# Altium footprint library 3.22-杂项.PcbLib: 985 footprints (part 7 of 64)
Each footprint in its own frame and in the unit in brackets; x right, y up, seen from the top. Pads: shape width x height; smd on the part's side, far side on the other; paste and mask are expansions set on the pad; w line width, h text height; cw(c..) or ccw(c..) is an arc to the next point about the centre after c.
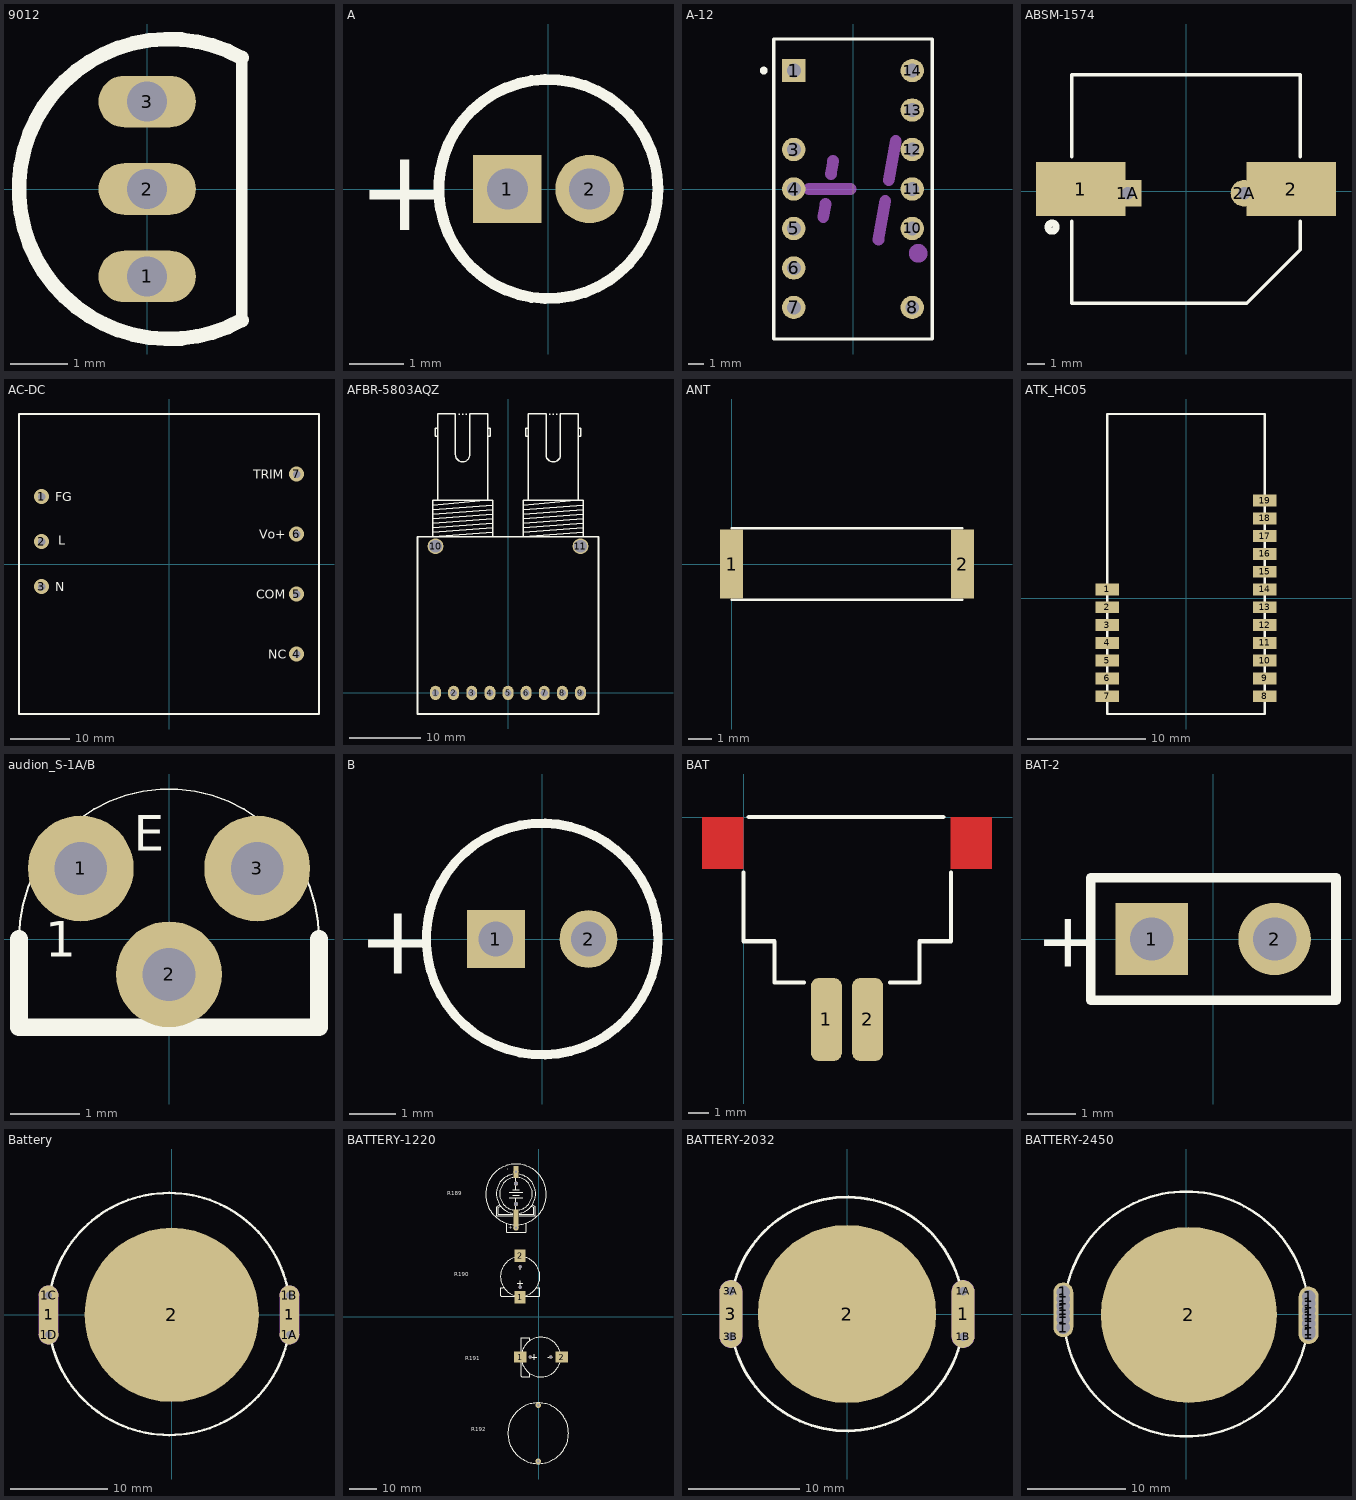
[diagram p6: the footprints below, top view; thin cyan lines are the x and y axes]

## 9012 [mm]
pads (3):
  oval 1.7x0.9 hole 0.7: 1(0,-1.524) 2(0,0) 3(0,1.524)
Top Overlay:
  lines w0.203: 1.651,-2.286 1.651,2.286
  lines w0.254: 1.651,-2.286 cw(c0.381,0) 1.651,2.286

## A [mm] "Capacitor, Electrolytic, Radial; Body 4 x 5 mm (Dia.xH typ); Pin Spacing 1.5 mm (typ)"
pads (2):
  rect 1.25x1.25 hole 0.75: 1(-0.75,0)
  round 1.25 hole 0.75: 2(0.75,0)
Top Overlay:
  circle w0.2: c0,0 r2
  text "+" at -3.475,-0.75 h1.5

## A-12 [mm] "LED, Universal ? Overflow, 7.62 mm, RHD; 14 Leads (2 Absent); Row Space 7.62 mm; Pitch 2.54 mm"
height 6.35
pads (12):
  rect 1.5x1.5 hole 0.9: 1(-3.81,7.62)
  round 1.5 hole 0.9: 3(-3.81,2.54) 4(-3.81,0) 5(-3.81,-2.54) 6(-3.81,-5.08) 7(-3.81,-7.62) 8(3.81,-7.62) 10(3.81,-2.54) 11(3.81,0) 12(3.81,2.54) 13(3.81,5.08) 14(3.81,7.62)
Top Overlay:
  circle w0.25: c-5.75,7.62 r0.125
  lines w0.2: -5.1,-9.65 5.1,-9.65 5.1,9.65 -5.1,9.65 -5.1,-9.65
Mechanical 1:
  circle w0.86: c4.19,-4.139 r0.17
  lines w0.762: -2.83,0 -0.17,0 ; -1.911,-1.799 -1.764,-0.962 ; -1.427,0.961 -1.28,1.8 ; 1.63,-3.262 2.071,-0.764 ; 2.303,0.565 2.747,3.084

## ABSM-1574 [mm] "Magnetic Transducer Buzzer"
pads (4):
  rect 5x3 smd: 1(-5.9,0.12) 2(5.9,0.12)
  rect 1.5x1.5 hole 0.7: 1A(-3.25,-0.12)
  round 1.5 hole 0.7: 2A(3.25,-0.12)
Top Overlay:
  circle w0.4: c-7.5,-2.014 r0.227
  lines w0.2: -6.4,-1.68 -6.4,-6.28 3.4,-6.28 6.4,-3.28 6.4,-1.68 ; -6.4,1.92 -6.4,6.52 6.4,6.52 6.4,1.92

## AC-DC [mil] "电源模块AC/DC，50.8宽，50.8长 陕西雷能电子"
height 500
pads (7):
  round 100 hole 50: 1(-850,450) 2(-850,150) 3(-850,-150) 4(850,-600) 5(850,-200) 6(850,200) 7(850,600)
Top Overlay:
  lines w12: -1000,-1000 1000,-1000 1000,1000 -1000,1000 -1000,-1000
  text "NC" at 660,-630 h60
  text "N" at -760,-180 h60
  text "COM" at 580,-230 h60
  text "TRIM" at 560,570 h60
  text "L" at -740,130 h60
  text "FG" at -760,420 h60
  text "Vo+" at 600,170 h60

## AFBR-5803AQZ [mm] "光以太网"
height 14.8
pads (11):
  oval 1.524x2 hole 1: 1(-10.16,0) 2(-7.62,0) 3(-5.08,0) 4(-2.54,0) 5(0,0) 6(2.54,0) 7(5.08,0) 8(7.62,0) 9(10.16,0)
  round 2.2 hole 1.8: 10(-10.16,20.54) 11(10.16,20.54)
Top Overlay:
  lines w0.2: -10.559,23.15 -2.159,23.785 ; -10.559,23.785 -2.159,24.42 ; -10.559,24.42 -2.159,25.055 ; -10.559,25.055 -2.159,25.69 ; -10.559,25.69 -2.159,26.325 ; -10.559,26.325 -3.184,26.98 ; -10.55,22.515 -2.159,23.15 ; -9.859,35.985 -10.225,35.985 -10.225,37.085 -9.859,37.085 ; -7.359,33.378 ccw(c-6.359,33.378) -5.359,33.385 -5.359,39.08 -2.859,39.08 -2.859,26.98 -9.859,26.98 -9.859,39.08 -7.359,39.08 -7.359,33.378 ; -6.923,39.047 -6.796,39.047 ; -6.415,39.047 -6.288,39.047 ; -5.907,39.047 -5.78,39.047 ; -2.859,35.985 -2.478,35.985 -2.478,37.085 -2.859,37.085 ; -2.168,22.515 -10.559,21.88 ; 2.141,23.15 10.541,23.785 ; 2.141,23.785 10.541,24.42 ; 2.141,24.42 10.541,25.055 ; 2.141,25.055 10.541,25.69 ; 2.141,25.69 10.541,26.325 ; 2.141,26.325 9.516,26.98 ; 2.15,22.515 10.541,23.15 ; 2.841,35.985 2.475,35.985 2.475,37.085 2.841,37.085 ; 5.341,33.378 ccw(c6.341,33.378) 7.341,33.385 7.341,39.08 9.841,39.08 9.841,26.98 2.841,26.98 2.841,39.08 5.341,39.08 5.341,33.378 ; 5.777,39.047 5.904,39.047 ; 6.285,39.047 6.412,39.047 ; 6.793,39.047 6.92,39.047 ; 9.841,35.985 10.222,35.985 10.222,37.085 9.841,37.085 ; 10.532,22.515 2.141,21.88 ; -10.559,21.88 -10.559,26.98 -2.159,26.98 -2.159,21.88 -10.559,21.88 ; 2.141,21.88 2.141,26.98 10.541,26.98 10.541,21.88 2.141,21.88
  lines w0.254: -12.7,-2.965 12.7,-2.965 ; -12.7,-2.92 -12.7,21.88 12.7,21.88 12.7,-2.92

## ANT [mm]
pads (2):
  rect 1x3 smd: 1(0,0) 2(9.995,0)
Top Overlay:
  lines w0.1: 0,-1.552 9.995,-1.552 ; 0,1.552 9.995,1.552
3D body: height 1.2, standoff 0, extent 0,-1.549 9.995,1.549

## ATK_HC05 [mm] "欢迎光临https://shop463601444.taobao.com 掌柜ID：黄晶宝石"
pads (19):
  rect 2x1 smd: 1(-6.65,0.75) 2(-6.65,-0.75) 3(-6.65,-2.25) 4(-6.65,-3.75) 5(-6.65,-5.25) 6(-6.65,-6.75) 7(-6.65,-8.25) 8(6.65,-8.25) 9(6.65,-6.75) 10(6.65,-5.25) 11(6.65,-3.75) 12(6.65,-2.25) 13(6.65,-0.75) 14(6.65,0.75) 15(6.65,2.25) 16(6.65,3.75) 17(6.65,5.25) 18(6.65,6.75) 19(6.65,8.25)
Top Overlay:
  lines w0.2: -6.65,-9.75 -6.65,15.55 6.65,15.55 6.65,-9.75 -6.65,-9.75

## audion_S-1A/B [mil] "小三极管，S－1A或S－1B型，切口看时从左到右为EBC"
pads (3):
  round 60 hole 30: 1(-50,40) 2(0,-20) 3(50,40)
Top Overlay:
  lines w1: -85,0 cw(c0,0) 85,0
  lines w10: -85,0 -85,-50 85,-50 85,0
  text "1" at -70,-10 h20
  text "E" at -20,50 h20

## B [mm] "Capacitor, Electrolytic, Radial; Body 5 x 6.8 mm (Dia.xH typ); Pin Spacing 2 mm (typ)"
pads (2):
  rect 1.25x1.25 hole 0.75: 1(-1,0)
  round 1.25 hole 0.75: 2(1,0)
Top Overlay:
  circle w0.2: c0,0 r2.5
  text "+" at -3.975,-0.75 h1.5

## BAT [mm]
pads (2):
  rrect50% 1.5x4 smd: 1(4,-9.778) 2(6,-9.778)
Top Layer:
  region: 12,-2.5 12,0 10,0 10,-2.5
  region: 0,-2.5 0,0 -2,0 -2,-2.5
Top Overlay:
  lines w0.2: 0,-2.667 0,-6 1.5,-6 1.5,-8 2.921,-8 ; 0.254,0 9.652,0 ; 7.079,-8 8.5,-8 8.5,-6 10,-6 10.033,-6 10.033,-2.667

## BAT-2 [mm] "Multicell Battery; 2 Leads"
pads (2):
  rect 1.5x1.5 hole 0.9: 1(-1.27,0)
  round 1.5 hole 0.9: 2(1.27,0)
Top Overlay:
  lines w0.2: -2.54,-1.27 -2.54,1.27 2.54,1.27 2.54,-1.27 -2.54,-1.27
  text "+" at -3.67,-0.577 h1.15

## Battery [mil]
pads (7):
  oval 78.74x240 all layers, no hole: 1(-501.24,0) 1(478.76,0)
  round 80 hole 30: 1A(478.76,-80) 1B(478.76,80) 1C(-501.24,80) 1D(-501.24,-80)
  round 708.66 smd: 2(0,0)
Top Overlay:
  circle w10: c-10.6,3.54 r492.49
Mechanical 1:
  lines w30: -501.24,-80 -501.24,80 ; 478.76,-80 478.76,80
Mechanical 2:
  lines w80: -501.24,-80 -501.24,80 ; 478.76,-80 478.76,80

## BATTERY-1220 [mm]
pads (17):
  round 1.2 hole 1.2: 0(-6.858,10.73) 0(-6.858,18.223) 0(-3.15,-14.822) 0(4.343,-14.822)
  round 2.032 hole 0.889: 1(-8.382,32.422) 2(-8.382,52.922) +(-0.254,-52.922) -(-0.254,-32.422)
  rect 2x4.4 smd: 1(-8.382,34.662) 1(-8.382,36.922) 2(-8.382,52.922)
  rect 4.5x4 smd: 1(-6.858,-14.822) 2(8.382,-14.822)
  rect 4x4.5 smd: 1(-6.858,7.022) 2(-6.858,22.262)
  round 1.6 hole 1.6 unplated: ""(-8.382,41.172) ""(-8.382,48.672)
Top Overlay:
  circle w0.25: c-8.382,44.722 r11.1
  circle w0.152: c-6.858,14.642 r7.22
  circle w0.152: c0.762,-14.822 r7.22
  circle w0.127: c-0.254,-42.672 r11.1
  lines w0.152: -12.954,10.578 -13.97,10.578 -13.97,7.53 -13.862,7.422 -6.858,7.422 0.146,7.422 0.254,7.53 0.254,10.578 -0.762,10.578 ; -7.874,12.102 -5.842,12.102 ; -6.858,11.086 -6.858,13.118 ; -6.858,17.182 -6.858,18.706 ; -3.302,-20.918 -3.302,-21.934 -6.35,-21.934 -6.458,-21.826 -6.458,-14.822 -6.458,-7.818 -6.35,-7.71 -3.302,-7.71 -3.302,-8.726 ; -2.794,-14.822 -0.762,-14.822 ; -1.778,-15.838 -1.778,-13.806 ; 3.302,-14.822 4.826,-14.822
  lines w0.254: -14.382,40.922 -15.382,40.172 -15.382,36.922 -9.632,36.922 ; -14.132,40.422 -14.882,39.922 -14.882,37.422 -9.632,37.422 ; -11.772,34.072 -11.772,30.812 -4.772,30.812 -4.782,34.132 ; -10.882,43.422 -5.882,43.422 ; -10.882,45.422 -5.882,45.422 ; -9.632,37.831 cw(c-8.382,44.922) -9.632,52.013 ; -9.632,44.422 -7.132,44.422 ; -9.632,46.422 -7.132,46.422 ; -9.424,39.013 cw(c-8.382,44.922) -9.424,50.831 ; -8.382,39.172 -8.382,43.172 ; -8.382,46.422 -8.382,50.672 ; -7.34,39.013 ccw(c-8.382,44.922) -7.34,50.831 ; -7.132,36.922 -1.382,36.922 -1.382,40.172 -2.382,40.922 ; -7.132,37.422 -1.882,37.422 -1.882,39.922 -2.632,40.422 ; -7.132,37.831 ccw(c-8.382,44.922) -7.132,52.013
  text "-" at -10.702,53.512 h1.52
  text "+" at -9.712,31.712 h1.52
  text "R189" at -33.452,44.309 h1.52
  text "R190" at -30.937,14.769 h1.52
  text "R191" at -27.026,-15.99 h1.52
  text "R192" at -24.79,-41.924 h1.52

## BATTERY-2032 [mil]
pads (7):
  oval 80x240 all layers, no hole: 1(410,0) 3(-410,0)
  round 60 hole 30: 1A(410,80) 1B(410,-80) 3A(-410,80) 3B(-410,-80)
  round 630 smd: 2(0,0)
Top Overlay:
  circle w10: c0,0 r413
Mechanical 1:
  lines w39.37: -410,-80 -410,80 ; 410,-80 410,80
Mechanical 2:
  lines w80: -410,-80 -410,80 ; 410,-80 410,80

## BATTERY-2450 [mil]
pads (16):
  round 80 hole 55: 1(-495,-51) 1(-495,-19) 1(-495,8) 1(-495,35) 1(-495,62) 1(-495,89) 1(492,-64) 1(492,-36) 1(492,-9) 1(492,18) 1(492,45) 1(492,72) 1(492.13,-78.03)
  oval 80x220 all layers, no hole: 1(-495,19) 1(492.13,1.97)
  round 708.66 smd: 2(10.24,-1.57)
via 492.13,-78.03 diameter 80 hole 30
Top Overlay:
  circle w10: c-0.36,1.97 r492.49